# Altium footprint library TeCrea-Misc.PCBLIB: 105 footprints (part 1 of 7)
Each footprint in its own frame and in the unit in brackets; x right, y up, seen from the top. Pads: shape width x height; smd on the part's side, far side on the other; paste and mask are expansions set on the pad; w line width, h text height; cw(c..) or ccw(c..) is an arc to the next point about the centre after c.
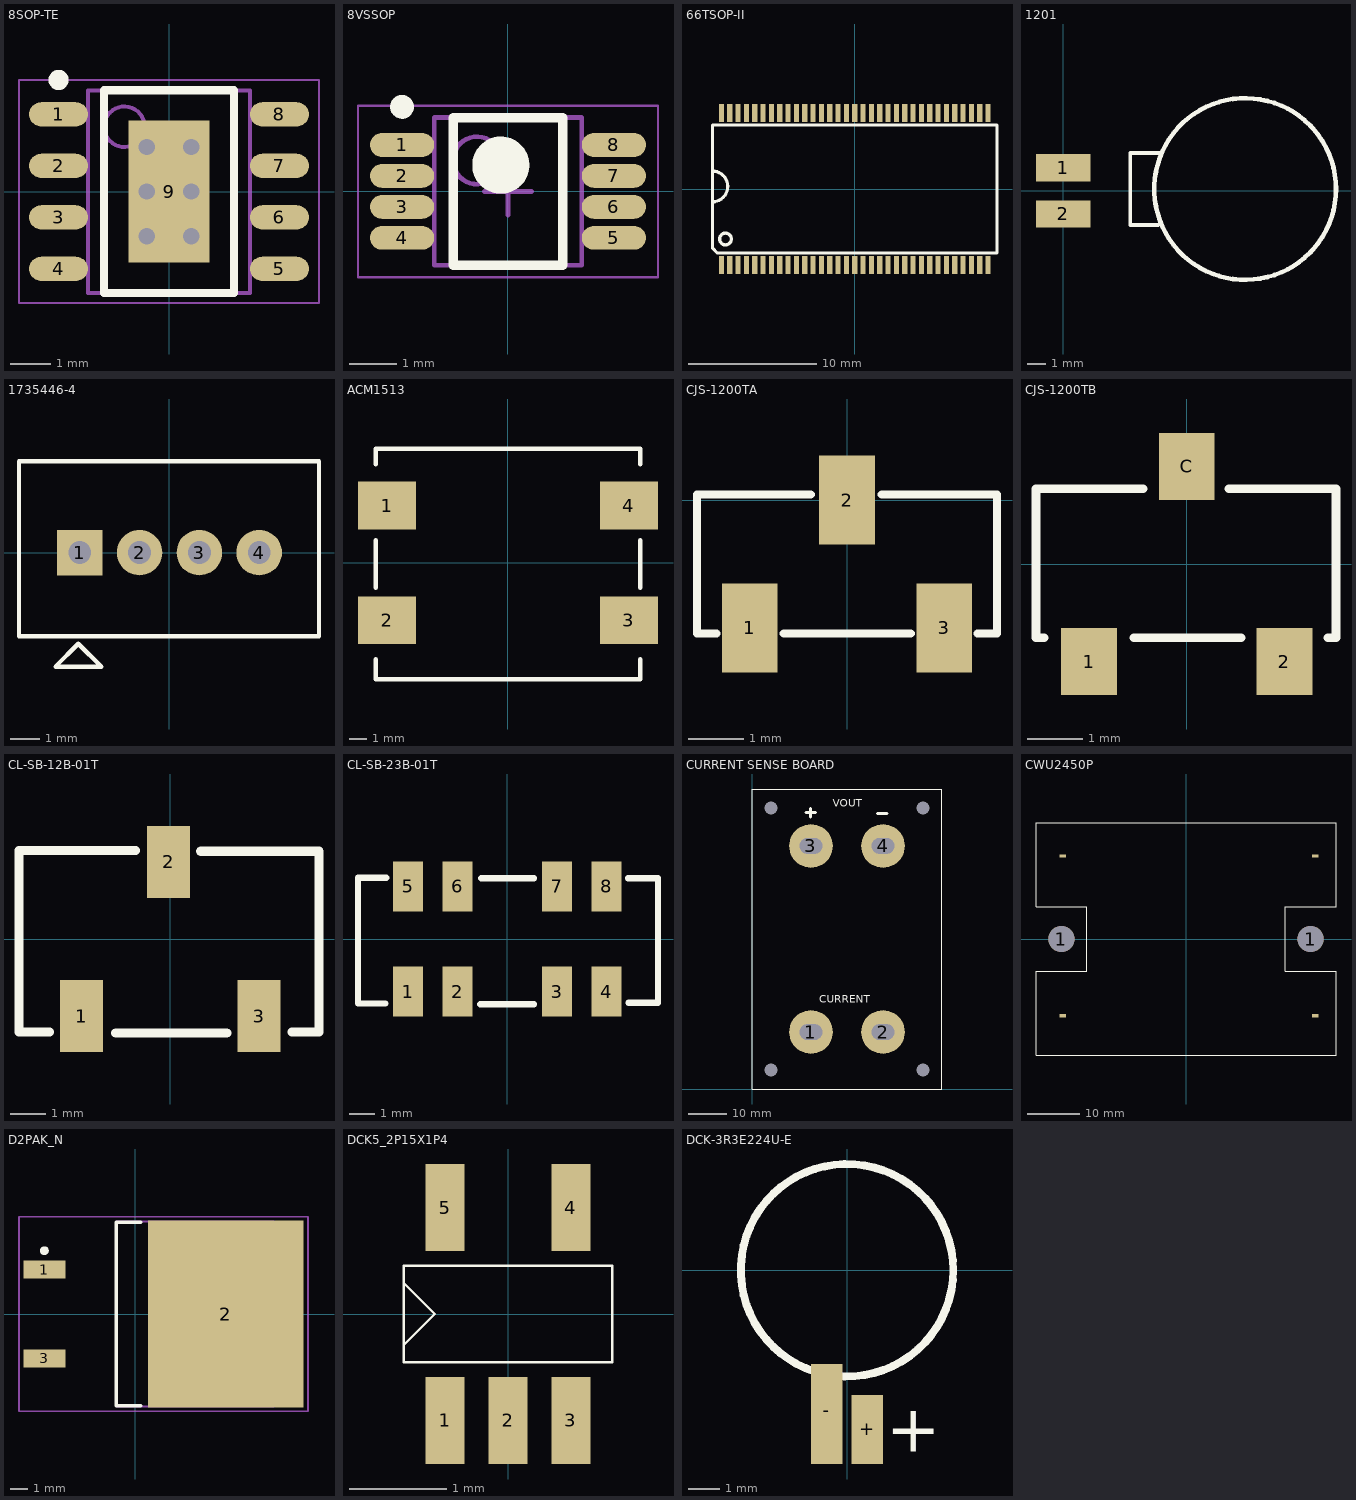
[diagram p0: the footprints below, top view; thin cyan lines are the x and y axes]

## 8-TSSOP [mm]

## 8SOP-TE [mm] "SOIC, 8-Leads, Body 4.90x3.90mm, Pitch 1.27mm, Thermal Pad 3.50x2.00mm, IPC Medium Density"
height 1.75
pads (9):
  oval 1.45x0.6 smd: 1(-2.725,1.905) 2(-2.725,0.635) 3(-2.725,-0.635) 4(-2.725,-1.905) 5(2.725,-1.905) 6(2.725,-0.635) 7(2.725,0.635) 8(2.725,1.905)
  rect 2x3.5 smd: 9(0,0)
via -0.55,1.1 diameter 0.5 hole 0.4
via 0.55,1.1 diameter 0.5 hole 0.4
via -0.55,0 diameter 0.5 hole 0.4
via 0.55,0 diameter 0.5 hole 0.4
via -0.55,-1.1 diameter 0.5 hole 0.4
via 0.55,-1.1 diameter 0.5 hole 0.4
Top Overlay:
  circle w0.25: c-2.725,2.755 r0.125
  lines w0.2: -1.6,-2.5 -1.6,2.5 1.6,2.5 1.6,-2.5 -1.6,-2.5
Mechanical 13:
  circle w0.1: c-1.1,1.6 r0.5
  lines w0.1: -2,-2.5 -2,2.5 2,2.5 2,-2.5 -2,-2.5
Mechanical 15:
  lines w0.05: -3.7,-2.75 -3.7,2.75 3.7,2.75 3.7,-2.75 -3.7,-2.75
  lines w0.1: -0.5,0 0.5,0 ; 0,-0.5 0,0.5
3D body "8SOP-TE.step": height 1.75, standoff 0, extent -3,-2.5 3,2.5

## 8VSSOP [mm]
height 1.1
pads (8):
  oval 1.35x0.5 smd: 1(-2.225,0.975) 2(-2.225,0.325) 3(-2.225,-0.325) 4(-2.225,-0.975) 5(2.225,-0.975) 6(2.225,-0.325) 7(2.225,0.325) 8(2.225,0.975)
Top Overlay:
  circle w0.6: c-0.15,0.55 r0.3
  circle w0.25: c-2.225,1.775 r0.125
  lines w0.2: -1.15,-1.55 1.15,-1.55 1.15,1.55 -1.15,1.55 -1.15,-1.55
Courtyard Top:
  lines w0.05: -3.15,-1.8 3.15,-1.8 3.15,1.8 -3.15,1.8 -3.15,-1.8
  lines w0.1: -0.5,0 0.5,0 ; 0,-0.5 0,0.5
Assembly Top:
  circle w0.1: c-0.65,0.65 r0.5
  lines w0.1: -1.55,-1.55 1.55,-1.55 1.55,1.55 -1.55,1.55 -1.55,-1.55
3D body "8VSSOP.step": height 1.1, standoff 0, extent -2.45,-1.55 2.45,1.55

## 66TSOP-II [mm]
pads (66):
  rect 0.4x1.4 smd: 1(-10.4,-5.925) 2(-9.75,-5.925) 3(-9.1,-5.925) 4(-8.45,-5.925) 5(-7.8,-5.925) 6(-7.15,-5.925) 7(-6.5,-5.925) 8(-5.85,-5.925) 9(-5.2,-5.925) 10(-4.55,-5.925) 11(-3.9,-5.925) 12(-3.25,-5.925) 13(-2.6,-5.925) 14(-1.95,-5.925) 15(-1.3,-5.925) 16(-0.65,-5.925) 17(0,-5.925) 18(0.65,-5.925) 19(1.3,-5.925) 20(1.95,-5.925) 21(2.6,-5.925) 22(3.25,-5.925) 23(3.9,-5.925) 24(4.55,-5.925) 25(5.2,-5.925) 26(5.85,-5.925) 27(6.5,-5.925) 28(7.15,-5.925) 29(7.8,-5.925) 30(8.45,-5.925) 31(9.1,-5.925) 32(9.75,-5.925) 33(10.4,-5.925) 34(10.4,5.925) 35(9.75,5.925) 36(9.1,5.925) 37(8.45,5.925) 38(7.8,5.925) 39(7.15,5.925) 40(6.5,5.925) 41(5.85,5.925) 42(5.2,5.925) 43(4.55,5.925) 44(3.9,5.925) 45(3.25,5.925) 46(2.6,5.925) 47(1.95,5.925) 48(1.3,5.925) 49(0.65,5.925) 50(0,5.925) 51(-0.65,5.925) 52(-1.3,5.925) 53(-1.95,5.925) 54(-2.6,5.925) 55(-3.25,5.925) 56(-3.9,5.925) 57(-4.55,5.925) 58(-5.2,5.925) 59(-5.85,5.925) 60(-6.5,5.925) 61(-7.15,5.925) 62(-7.8,5.925) 63(-8.45,5.925) 64(-9.1,5.925) 65(-9.75,5.925) 66(-10.4,5.925)
Top Overlay:
  circle w0.254: c-10.075,-3.9 r0.459
  lines w0.254: -11.1,-1 ccw(c-11.1,0.2) -11.1,1.4 ; -11.1,-1 -11.1,-4.6 -10.7,-5 11.1,-5 11.1,5 -11.1,5 -11.1,1.4 ; -11.1,-1 -11.1,1.4
3D body "TSOP66.step": height 1.13, standoff -0.07, extent -11.1,-5.969 11.12,5.791

## 1201 [mm] "VIBRATION ERM MTR 11000 RPM 5V"
pads (2):
  rect 3x1.5 smd: 1(0,1.27) 2(0,-1.27)
Top Overlay:
  circle w0.254: c10.008,0.103 r5
  lines w0.2: 5.359,-1.739 5.221,-1.878 3.683,-1.878 3.683,2.085 5.359,2.085
3D body: height 3, standoff 0, extent 4.982,-4.896 14.982,5.104
3D body: height 1.5, standoff 0, extent 3.695,-1.877 6.269,2.085
3D body: height 0.7, standoff 0.3, extent -0.96,1.17 6.04,1.57
3D body: height 0.7, standoff 0.3, extent -0.96,-1.37 6.04,-0.97

## 1735446-4 [mil]
pads (4):
  rect 60x60 hole 30: 1(-118.11,0)
  round 60 hole 30: 2(-39.37,0) 3(39.37,0) 4(118.11,0)
Top Overlay:
  lines w5.91: -198.11,-110 196.89,-110 196.89,120 -198.11,120 -198.11,-110 ; -150,-150 -100,-150 -90,-150 -120,-120 -150,-150
3D body "c-1735446-4-c-3d.stp": height 239.48, standoff -133.36, extent -196.11,-111 197.59,117.35

## ACM1513 [mm]
pads (4):
  rect 3.3x2.7 smd: 1(-6.85,3.25) 2(-6.85,-3.25) 3(6.85,-3.25) 4(6.85,3.25)
Top Overlay:
  lines w0.254: -7.493,-5.461 -7.493,-6.604 7.493,-6.604 7.493,-5.461 ; -7.493,-1.397 -7.493,1.27 ; -7.493,5.588 -7.493,6.477 7.493,6.477 7.493,5.588 ; 7.493,-1.397 7.493,1.27
3D body "acm1513.step": height 5.51, standoff 0.01, extent -7.453,-6.533 7.547,6.467

## CJS-1200TA [mm]
pads (3):
  rect 1x1.6 smd mask+0.068: 1(-1.75,-2.3) 2(0,0) 3(1.75,-2.3)
Top Overlay:
  lines w0.15: -2.35,-2.4 -2.7,-2.4 -2.7,0.1 -0.65,0.1 ; -1.138,-2.4 1.15,-2.4 ; 0.625,0.1 2.7,0.1 2.7,-2.4 2.35,-2.4
3D body "CJS-1200TA.stp": height 2.53, standoff 0.01, extent -2.685,-2.5 2.715,0.3

## CJS-1200TB [mm] "Dip Switch SPDT 2 Position Surface Mount Slide (Standard) Actuator 100mA 6VDC"
pads (3):
  rect 1x1.2 smd: 1(-1.75,-1.75) 2(1.75,-1.75) C(0,1.75)
Top Overlay:
  lines w0.152: -2.55,-1.325 -2.7,-1.325 -2.7,1.35 -0.775,1.35 ; -0.95,-1.325 0.975,-1.325 ; 0.75,1.35 2.675,1.35 2.675,-1.325 2.525,-1.325
3D body "CJS-1200TB.stp": height 2.53, standoff 0.01, extent -2.7,-2.1 2.7,2.1

## CL-SB-12B-01T [mm]
pads (3):
  rect 1.2x2 smd: 1(-2.475,-2.15) 2(-0.05,2.15) 3(2.475,-2.15)
Top Overlay:
  lines w0.254: -3.375,-2.6 -4.225,-2.6 -4.225,2.475 -0.975,2.475 ; -1.525,-2.625 1.575,-2.625 ; 0.85,2.45 4.15,2.45 4.15,-2.6 3.4,-2.6
3D body "CL-SB-12B-01T.stp": height 5.51, standoff -0.79, extent -4.275,-2.55 4.225,2.45

## CL-SB-23B-01T [mm] "Slide Switch DP3T Surface Mount"
pads (8):
  rect 1.2x2 smd: 1(-3.962,-2.1) 2(-1.987,-2.1) 3(1.988,-2.1) 4(3.963,-2.1) 5(-3.962,2.1) 6(-1.987,2.1) 7(1.988,2.1) 8(3.963,2.1)
Top Overlay:
  lines w0.254: -4.862,-2.575 -5.963,-2.575 -5.963,2.45 -4.837,2.45 ; -1.087,-2.6 1.062,-2.6 ; -1.037,2.425 1.062,2.425 ; 4.812,2.425 6.013,2.425 6.013,-2.55 4.838,-2.55
3D body "CL-SB-23B-01T.stp": height 5.51, standoff 0.01, extent -5.988,-2.55 6.012,2.45

## CURRENT SENSE BOARD [mm]
pads (8):
  round 11.5 / inner round 10 / far side round 11 hole 4.1 slot 6 at 0 deg mask+0: 1(15.5,15) 2(34.5,15) 3(15.5,64) 4(34.5,64)
  round 0 hole 3.5 unplated mask+2: P(5,5) P(5,74) P(45,5) P(45,74)
Top Overlay:
  lines w0.16: 0,0 50,0 50,79 0,79 0,0
  lines w0.8: 14.249,72.771 16.637,72.771 ; 15.443,71.628 15.443,73.838 ; 33.096,72.593 35.484,72.593
  text "CURRENT" at 17.678,22.758 h2
  text "VOUT" at 21.209,74.27 h2

## CWU2450P [mm]
pads (6):
  round 5 hole 5: 1(-23.8,0) 1(23.8,0)
  rect 1.27x0.635 smd: 1(24.69,15.85) 2(24.69,-14.63) 3(-23.57,-14.63) 4(-23.57,15.85)
Top Overlay:
  lines w0.127: -28.65,-22.25 -28.65,-6.2 -18.95,-6.2 -18.95,6.2 -28.65,6.2 -28.65,22.25 28.65,22.25 28.65,6.2 18.95,6.2 18.95,-6.2 28.65,-6.2 28.65,-22.25 -28.65,-22.25
3D body "101901.step": height 31.03, standoff 0.01, extent -29.544,-22.025 29.305,22.425

## D2PAK_N [mm] "D2-PAK, 4-Leads, Body 8.8x10.4mm, Pitch 2.54mm, Lead Span 15.1mm, IPC Medium Density"
height 4.69
pads (3):
  rect 2.4x1.05 smd: 1(-5.175,2.54) 3(-5.175,-2.54)
  rect 8.9x10.65 smd: 2(5.175,0)
Top Overlay:
  circle w0.25: c-5.175,3.615 r0.125
  lines w0.2: 0.325,-5.25 -1.075,-5.25 -1.075,5.25 0.325,5.25
Mechanical 13:
  lines w0.1: -1.075,-5.275 7.925,-5.275 7.925,5.275 -1.075,5.275 -1.075,-5.275
Mechanical 15:
  lines w0.1: 1.125,0 2.125,0 ; 1.625,-0.5 1.625,0.5 ; -6.625,-5.55 9.875,-5.55 9.875,5.55 -6.625,5.55 -6.625,-5.55
3D body "User Library-DPAK.step": height 4.98, standoff -0.04, extent -6.14,-5.08 9.124,5.08

## DCK5_2P15X1P4 [mm] "DCK5_2P15X1P4"
pads (5):
  rect 0.4x0.9 smd mask+0.051: 1(-0.65,-1.1) 2(0,-1.1) 3(0.65,-1.1) 4(0.65,1.1) 5(-0.65,1.1)
Top Overlay:
  lines w0.025: -1.075,-0.318 -0.757,0 -1.075,0.318 ; -1.075,-0.5 -1.075,0.5 1.075,0.5 1.075,-0.5 -1.075,-0.5
3D body "SOT353-SC70-5.step": height 1, standoff 0, extent -1.05,-1.15 1.05,1.15

## DCK-3R3E224U-E [mm] "SuperCap"
pads (2):
  rect 1x2.2 smd: +(0.65,-5.1)
  rect 1x3.2 smd: -(-0.65,-4.6)
Top Overlay:
  circle w0.254: c0,0 r3.4
  text "+" at 1.25,-5.8 h1.52
3D body: height 0.15, standoff 0, extent 0.425,-5.775 0.875,-4.2
3D body: height 1.65, standoff 0.15, extent -3.4,-3.4 3.4,3.4
3D body: height 0.15, standoff 0, extent -0.875,-5.75 0.875,1
3D body: height 1.8, standoff 1.65, extent -0.875,-4.05 0.875,1
3D body: height 1.8, standoff 0, extent 0,-4.2 0.875,-4.05
3D body: height 1.85, standoff 0, extent -0.297,-0.299 0.3,0.3
3D body: height 1.85, standoff 0, extent -0.298,-2.674 0.3,-2.075